# Altium footprint library PcbLib1.PcbLib: 3 footprints
Each footprint in its own frame and in the unit in brackets; x right, y up, seen from the top. Pads: shape width x height; smd on the part's side, far side on the other; paste and mask are expansions set on the pad; w line width, h text height; cw(c..) or ccw(c..) is an arc to the next point about the centre after c.
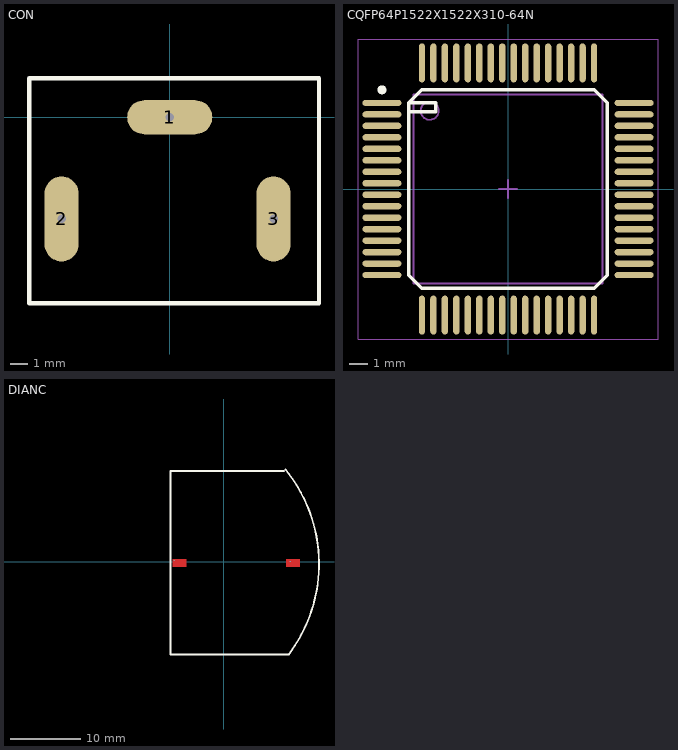
[diagram p0: the footprints below, top view; thin cyan lines are the x and y axes]

## CON [mm]
pads (3):
  oval 5x2 hole 0.5: 1(0,0)
  oval 2x5 hole 0.5: 2(-6.35,-5.969) 3(6.096,-5.969)
Top Overlay:
  lines w0.254: -8.255,-10.922 8.763,-10.922 8.763,2.286 -8.255,2.286 -8.255,-10.922

## CQFP64P1522X1522X310-64N [mm] "CQFP, 64-Leads, Body 15.22x15.22mm, Pitch 0.64mm, IPC Medium Density"
height 3.1
pads (64):
  oval 2.15x0.35 smd: 1(-6.975,4.763) 2(-6.975,4.127) 3(-6.975,3.492) 4(-6.975,2.857) 5(-6.975,2.222) 6(-6.975,1.587) 7(-6.975,0.953) 8(-6.975,0.318) 9(-6.975,-0.318) 10(-6.975,-0.953) 11(-6.975,-1.587) 12(-6.975,-2.222) 13(-6.975,-2.857) 14(-6.975,-3.492) 15(-6.975,-4.127) 16(-6.975,-4.763) 33(6.975,-4.763) 34(6.975,-4.127) 35(6.975,-3.492) 36(6.975,-2.857) 37(6.975,-2.222) 38(6.975,-1.587) 39(6.975,-0.953) 40(6.975,-0.318) 41(6.975,0.318) 42(6.975,0.953) 43(6.975,1.587) 44(6.975,2.222) 45(6.975,2.857) 46(6.975,3.492) 47(6.975,4.127) 48(6.975,4.763)
  oval 0.35x2.15 smd: 17(-4.763,-6.975) 18(-4.127,-6.975) 19(-3.492,-6.975) 20(-2.857,-6.975) 21(-2.222,-6.975) 22(-1.587,-6.975) 23(-0.953,-6.975) 24(-0.318,-6.975) 25(0.318,-6.975) 26(0.953,-6.975) 27(1.587,-6.975) 28(2.222,-6.975) 29(2.857,-6.975) 30(3.492,-6.975) 31(4.127,-6.975) 32(4.763,-6.975) 49(4.763,6.975) 50(4.127,6.975) 51(3.492,6.975) 52(2.857,6.975) 53(2.222,6.975) 54(1.587,6.975) 55(0.953,6.975) 56(0.318,6.975) 57(-0.318,6.975) 58(-0.953,6.975) 59(-1.587,6.975) 60(-2.222,6.975) 61(-2.857,6.975) 62(-3.492,6.975) 63(-4.127,6.975) 64(-4.763,6.975)
Top Overlay:
  circle w0.25: c-6.975,5.487 r0.125
  lines w0.2: -5.5,4.265 -4,4.265 -4,4.765 -5.5,4.765 ; -5.5,4.765 -5.5,-4.765 -4.765,-5.5 4.765,-5.5 5.5,-4.765 5.5,4.765 4.765,5.5 -4.765,5.5 -5.5,4.765
Mechanical 13:
  circle w0.1: c-4.33,4.33 r0.5
  lines w0.1: -5.23,-5.23 -5.23,5.23 5.23,5.23 5.23,-5.23 -5.23,-5.23
Mechanical 15:
  lines w0.05: -8.3,-8.3 -8.3,8.3 8.3,8.3 8.3,-8.3 -8.3,-8.3
  lines w0.1: -0.5,0 0.5,0 ; 0,-0.5 0,0.5
3D body: height 3.1, standoff 0.25, extent -5.23,-5.23 5.23,5.23

## DIANC [mm]
pads (2):
  round 0.1 hole 0.01: 1(-7.112,0.127) 2(9.525,0)
Top Layer:
  rectangle: -7.366,-0.762 -5.334,0.381
  rectangle: 8.89,-0.762 10.922,0.381
Top Overlay:
  lines w0.254: 8.619,12.954 -7.62,12.954 -7.62,-0.127 -7.62,-13.335 9.276,-13.335 ccw(c-7.845,-0.352) 8.845,13.18